# Altium footprint library 2.03-TSSOP封装.PcbLib: 42 footprints (part 3 of 3)
Each footprint in its own frame and in the unit in brackets; x right, y up, seen from the top. Pads: shape width x height; smd on the part's side, far side on the other; paste and mask are expansions set on the pad; w line width, h text height; cw(c..) or ccw(c..) is an arc to the next point about the centre after c.
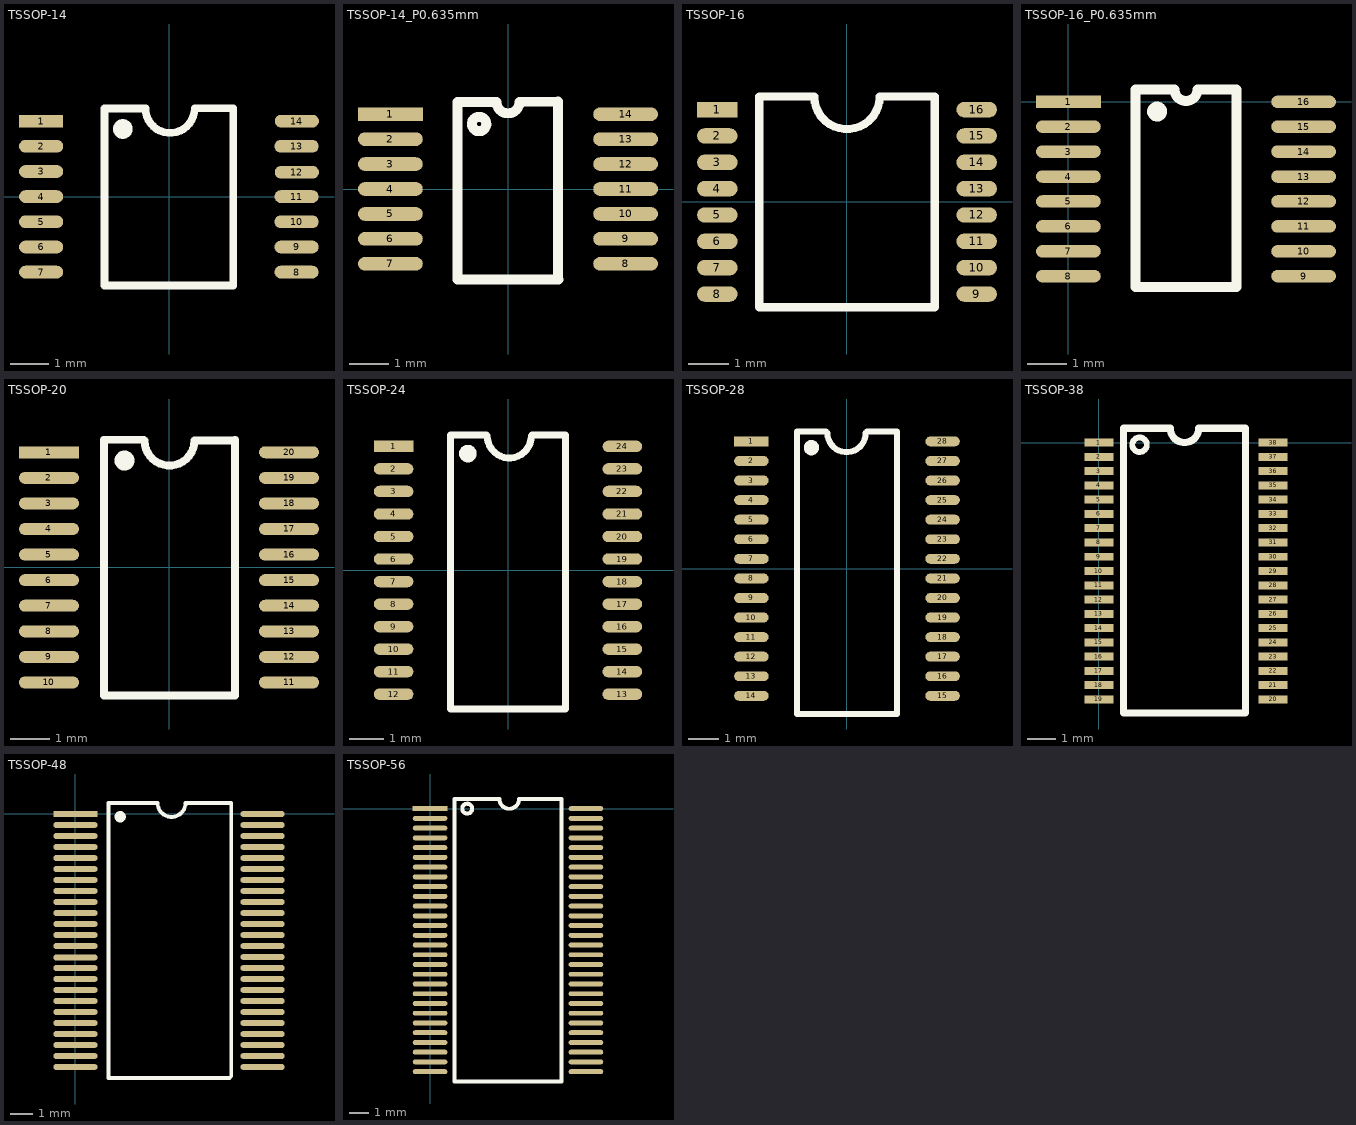
[diagram p2: the footprints below, top view; thin cyan lines are the x and y axes]

## TSSOP-14 [mm] "4.96x4.40x1.00 e=0.65       [ PCBѧϰȺ514746572 ]"
pads (14):
  rect 1.143x0.33 smd: 1(-3.304,1.95)
  oval 1.143x0.33 smd: 2(-3.304,1.3) 3(-3.304,0.65) 4(-3.304,0) 5(-3.304,-0.65) 6(-3.304,-1.3) 7(-3.304,-1.95) 8(3.296,-1.95) 9(3.296,-1.3) 10(3.296,-0.65) 11(3.296,0) 12(3.304,0.629) 13(3.296,1.3) 14(3.304,1.95)
Top Overlay:
  circle w0.254: c-1.192,1.747 r0.127
  lines w0.2: -0.617,2.275 -1.669,2.275 -1.669,-2.299 1.661,-2.299 1.661,2.275 ; -0.608,2.28 ccw(c0.027,2.28) 0.662,2.28 1.656,2.28
3D body "TSSOP14.STEP": height 1.03, standoff -0.02, extent -3.202,-2.5 3.202,2.5

## TSSOP-14_P0.635mm [mil] "[ PCBѧϰȺ514746572 ]"
pads (14):
  rect 65x13.78 smd: 1(-118,75)
  oval 65x13.78 smd: 2(-118,50) 3(-118,25) 4(-118,0) 5(-118,-25) 6(-118,-50) 7(-118,-75) 8(118,-75) 9(118,-50) 10(118,-25) 11(118,0) 12(118,25) 13(118,50) 14(118,75)
Top Overlay:
  lines w10: -29,58 cw(c-29,65.21) -27.98,58.07 ; 50,-91 50,88 11.54,87.5 cw(c0,87.5) -11.54,87.5 -50.5,87.5 -50.5,-91 50.5,-91
3D body "TSSOP14.STEP": height 40.55, standoff -0.76, extent -126.06,-98.42 126.07,98.43

## TSSOP-16 [mm] "[ PCBѧϰȺ514746572 ]"
pads (16):
  rect 1x0.381 smd: 1(-3.2,2.275)
  oval 1x0.381 smd: 2(-3.2,1.625) 3(-3.2,0.975) 4(-3.2,0.325) 5(-3.2,-0.325) 6(-3.2,-0.975) 7(-3.2,-1.625) 8(-3.2,-2.275) 9(3.2,-2.275) 10(3.2,-1.625) 11(3.2,-0.975) 12(3.2,-0.325) 13(3.2,0.325) 14(3.2,0.975) 15(3.2,1.625) 16(3.2,2.275)
Top Overlay:
  lines w0.2: -0.812,2.6 -2.165,2.6 -2.165,-2.6 2.165,-2.6 2.165,2.6 0.813,2.6 ; -0.808,2.6 ccw(c0,2.6) 0.808,2.6
3D body "TSSOP16.STEP": height 1.03, standoff -0.02, extent -3.202,-2.5 3.202,2.5

## TSSOP-16_P0.635mm [mil] "4.96x4.40x1.00        [ PCBѧϰȺ514746572 ]"
pads (16):
  rect 65x12.5 smd: 1(0,0)
  oval 65x12.5 smd: 2(0,-25) 3(0,-50) 4(0,-75) 5(0,-100) 6(0,-125) 7(0,-150) 8(0,-175) 9(236,-175) 10(236,-150) 11(236,-125) 12(236,-100) 13(236,-75) 14(236,-50) 15(236,-25) 16(236,0)
Top Overlay:
  lines w10: 89,-14.79 cw(c89,-9.79) 89.71,-14.74 ; 67.5,-186 67.5,12.5 106.46,12.5 ccw(c118,12.5) 129.54,12.5 168.5,12.5 168.5,-186 67.5,-186
3D body "TSSOP16.STEP": height 40.55, standoff -0.76, extent -9.92,-186.02 242.21,10.83

## TSSOP-20 [mm] "[ PCBѧϰȺ514746572 ]"
pads (20):
  rect 1.524x0.305 smd: 1(-3.05,2.925)
  oval 1.524x0.305 smd: 2(-3.05,2.275) 3(-3.05,1.625) 4(-3.05,0.975) 5(-3.05,0.325) 6(-3.05,-0.325) 7(-3.05,-0.975) 8(-3.05,-1.625) 9(-3.05,-2.275) 10(-3.05,-2.925) 11(3.05,-2.925) 12(3.05,-2.275) 13(3.05,-1.625) 14(3.05,-0.975) 15(3.05,-0.325) 16(3.05,0.325) 17(3.05,0.975) 18(3.05,1.625) 19(3.05,2.275) 20(3.05,2.925)
Top Overlay:
  circle w0.254: c-1.131,2.715 r0.127
  lines w0.2: -0.643,3.243 -1.655,3.243 -1.655,-3.257 1.675,-3.257 1.675,3.243 ; -0.623,3.223 ccw(c0.012,3.223) 0.647,3.223 1.655,3.223
3D body "TSSOP20.STEP": height 1.03, standoff -0.02, extent -3.202,-3.25 3.202,3.25

## TSSOP-24 [mm] "7.80x4.40x1.00 e=0.65      [ PCBѧϰȺ514746572 ]"
pads (24):
  rect 1.143x0.33 smd: 1(-3.3,3.575)
  oval 1.143x0.33 smd: 2(-3.3,2.925) 3(-3.3,2.275) 4(-3.3,1.625) 5(-3.3,0.975) 6(-3.3,0.325) 7(-3.3,-0.325) 8(-3.3,-0.975) 9(-3.3,-1.625) 10(-3.3,-2.275) 11(-3.3,-2.925) 12(-3.3,-3.575) 13(3.3,-3.575) 14(3.3,-2.925) 15(3.3,-2.275) 16(3.3,-1.625) 17(3.3,-0.975) 18(3.3,-0.325) 19(3.3,0.325) 20(3.3,0.975) 21(3.3,1.625) 22(3.3,2.275) 23(3.3,2.925) 24(3.3,3.575)
Top Overlay:
  circle w0.254: c-1.157,3.367 r0.127
  lines w0.2: -0.624,3.9 -1.665,3.9 -1.665,-3.999 1.665,-3.999 1.665,3.9 0.697,3.9 ; -0.598,3.875 ccw(c0.037,3.875) 0.672,3.875
3D body "TSSOP24.STEP": height 1.03, standoff -0.02, extent -3.202,-3.9 3.202,3.9

## TSSOP-28 [mm] "9.70x4.40x1.00 e=0.65      [ PCBѧϰȺ514746572 ]"
pads (28):
  rect 1.143x0.33 smd: 1(-3.175,4.225)
  oval 1.143x0.33 smd: 2(-3.175,3.575) 3(-3.175,2.925) 4(-3.175,2.275) 5(-3.175,1.625) 6(-3.175,0.975) 7(-3.175,0.325) 8(-3.175,-0.325) 9(-3.175,-0.975) 10(-3.175,-1.625) 11(-3.175,-2.275) 12(-3.175,-2.925) 13(-3.175,-3.575) 14(-3.175,-4.225) 15(3.175,-4.225) 16(3.175,-3.575) 17(3.175,-2.925) 18(3.175,-2.275) 19(3.175,-1.625) 20(3.175,-0.975) 21(3.175,-0.325) 22(3.175,0.325) 23(3.175,0.975) 24(3.175,1.625) 25(3.175,2.275) 26(3.175,2.925) 27(3.175,3.575) 28(3.175,4.225)
Top Overlay:
  circle w0.254: c-1.182,4.017 r0.127
  lines w0.2: -0.7,4.55 -1.665,4.55 -1.665,-4.829 1.665,-4.829 1.665,4.55 0.672,4.55 ; -0.649,4.499 ccw(c-0.014,4.499) 0.621,4.499
3D body "TSSOP28.STEP": height 1.03, standoff -0.02, extent -3.202,-4.9 3.202,4.9

## TSSOP-38 [mil] "[ PCBѧϰȺ514746572 ]"
pads (38):
  rect 40x11 smd: 1(0,0) 2(0,-19.68) 3(0,-39.37) 4(0,-59.05) 5(0,-78.74) 6(0,-98.42) 7(0,-118.11) 8(0,-137.79) 9(0,-157.48) 10(0,-177.16) 11(0,-196.85) 12(0,-216.53) 13(0,-236.22) 14(0,-255.91) 15(0,-275.59) 16(0,-295.28) 17(0,-314.96) 18(0,-334.65) 19(0,-354.33) 20(240.16,-354.33) 21(240.16,-334.65) 22(240.16,-314.96) 23(240.16,-295.28) 24(240.16,-275.59) 25(240.16,-255.91) 26(240.16,-236.22) 27(240.16,-216.53) 28(240.16,-196.85) 29(240.16,-177.16) 30(240.16,-157.48) 31(240.16,-137.79) 32(240.16,-118.11) 33(240.16,-98.42) 34(240.16,-78.74) 35(240.16,-59.05) 36(240.16,-39.37) 37(240.16,-19.68) 38(240.16,0)
Top Overlay:
  circle w8: c56,-3 r10
  lines w10: 34,-373.03 34,19.68 98.31,19.68 ccw(c118,19.68) 137.69,19.68 202,19.68 202,-373.03 34,-373.03

## TSSOP-48 [mm] "12.50×6.10×0.95 e=0.50      [ PCB学习群514746572 ]"
pads (48):
  rect 2x0.279 smd: 1(0,0)
  oval 2x0.279 smd: 2(0,-0.5) 3(0,-1) 4(0,-1.5) 5(0,-2) 6(0,-2.5) 7(0,-3) 8(0,-3.5) 9(0,-4) 10(0,-4.5) 11(0,-5) 12(0,-5.5) 13(0,-6) 14(0,-6.52) 15(0,-7) 16(0,-7.5) 17(0,-8) 18(0,-8.5) 19(0,-9) 20(0,-9.5) 21(0,-10) 22(0,-10.5) 23(0,-11) 24(0,-11.5) 25(8.5,-11.5) 26(8.5,-11) 27(8.5,-10.5) 28(8.5,-10) 29(8.5,-9.5) 30(8.5,-9) 31(8.5,-8.5) 32(8.5,-8) 33(8.5,-7.5) 34(8.5,-7) 35(8.5,-6.5) 36(8.5,-6) 37(8.5,-5.5) 38(8.5,-5) 39(8.5,-4.5) 40(8.5,-4) 41(8.5,-3.5) 42(8.5,-3) 43(8.5,-2.5) 44(8.5,-2) 45(8.5,-1.5) 46(8.5,-1) 47(8.5,-0.5) 48(8.5,0)
Top Overlay:
  circle w0.254: c2.032,-0.127 r0.127
  lines w0.178: 7,-12 7.081,-11.919 ; 7,-12 1.5,-12 1.5,0.5 3.73,0.5 ccw(c4.365,0.5) 5,0.5 7.081,0.5 7.081,-11.919 ; 7,-12 7.081,-11.919
3D body "TSSOP48.STEP": height 1.1, standoff 0.02, extent 0.091,-11.965 8.291,0.535

## TSSOP-56 [mil] "[ PCBѧϰȺ514746572 ]"
pads (56):
  rect 70x10 smd: 1(0,0)
  oval 70x10 smd: 2(0,-19.68) 3(0,-39.37) 4(0,-59.05) 5(0,-78.74) 6(0,-98.42) 7(0,-118.11) 8(0,-137.79) 9(0,-157.48) 10(0,-177.16) 11(0,-196.85) 12(0,-216.53) 13(0,-236.22) 14(0,-255.91) 15(0,-275.59) 16(0,-295.28) 17(0,-314.96) 18(0,-334.65) 19(0,-354.33) 20(0,-374.02) 21(0,-393.7) 22(0,-413.39) 23(0,-433.07) 24(0,-452.76) 25(0,-472.44) 26(0,-492.13) 27(0,-511.81) 28(0,-531.5) 29(314.96,-531.5) 30(314.96,-511.81) 31(314.96,-492.13) 32(314.96,-472.44) 33(314.96,-452.76) 34(314.96,-433.07) 35(314.96,-413.39) 36(314.96,-393.7) 37(314.96,-374.02) 38(314.96,-354.33) 39(314.96,-334.65) 40(314.96,-314.96) 41(314.96,-295.28) 42(314.96,-275.59) 43(314.96,-255.91) 44(314.96,-236.22) 45(314.96,-216.53) 46(314.96,-196.85) 47(314.96,-177.16) 48(314.96,-157.48) 49(314.96,-137.79) 50(314.96,-118.11) 51(314.96,-98.42) 52(314.96,-78.74) 53(314.96,-59.05) 54(314.96,-39.37) 55(314.96,-19.68) 56(314.96,0)
Top Overlay:
  circle w8: c75,0 r10
  lines w8: 49.21,-551.18 265.75,-551.18 265.75,19.68 180,19.68 cw(c160,19.68) 140,19.69 49.21,19.68 49.21,-551.18